# Altium footprint library AD_Lib.PcbLib: 508 footprints (part 29 of 32)
Each footprint in its own frame and in the unit in brackets; x right, y up, seen from the top. Pads: shape width x height; smd on the part's side, far side on the other; paste and mask are expansions set on the pad; w line width, h text height; cw(c..) or ccw(c..) is an arc to the next point about the centre after c.
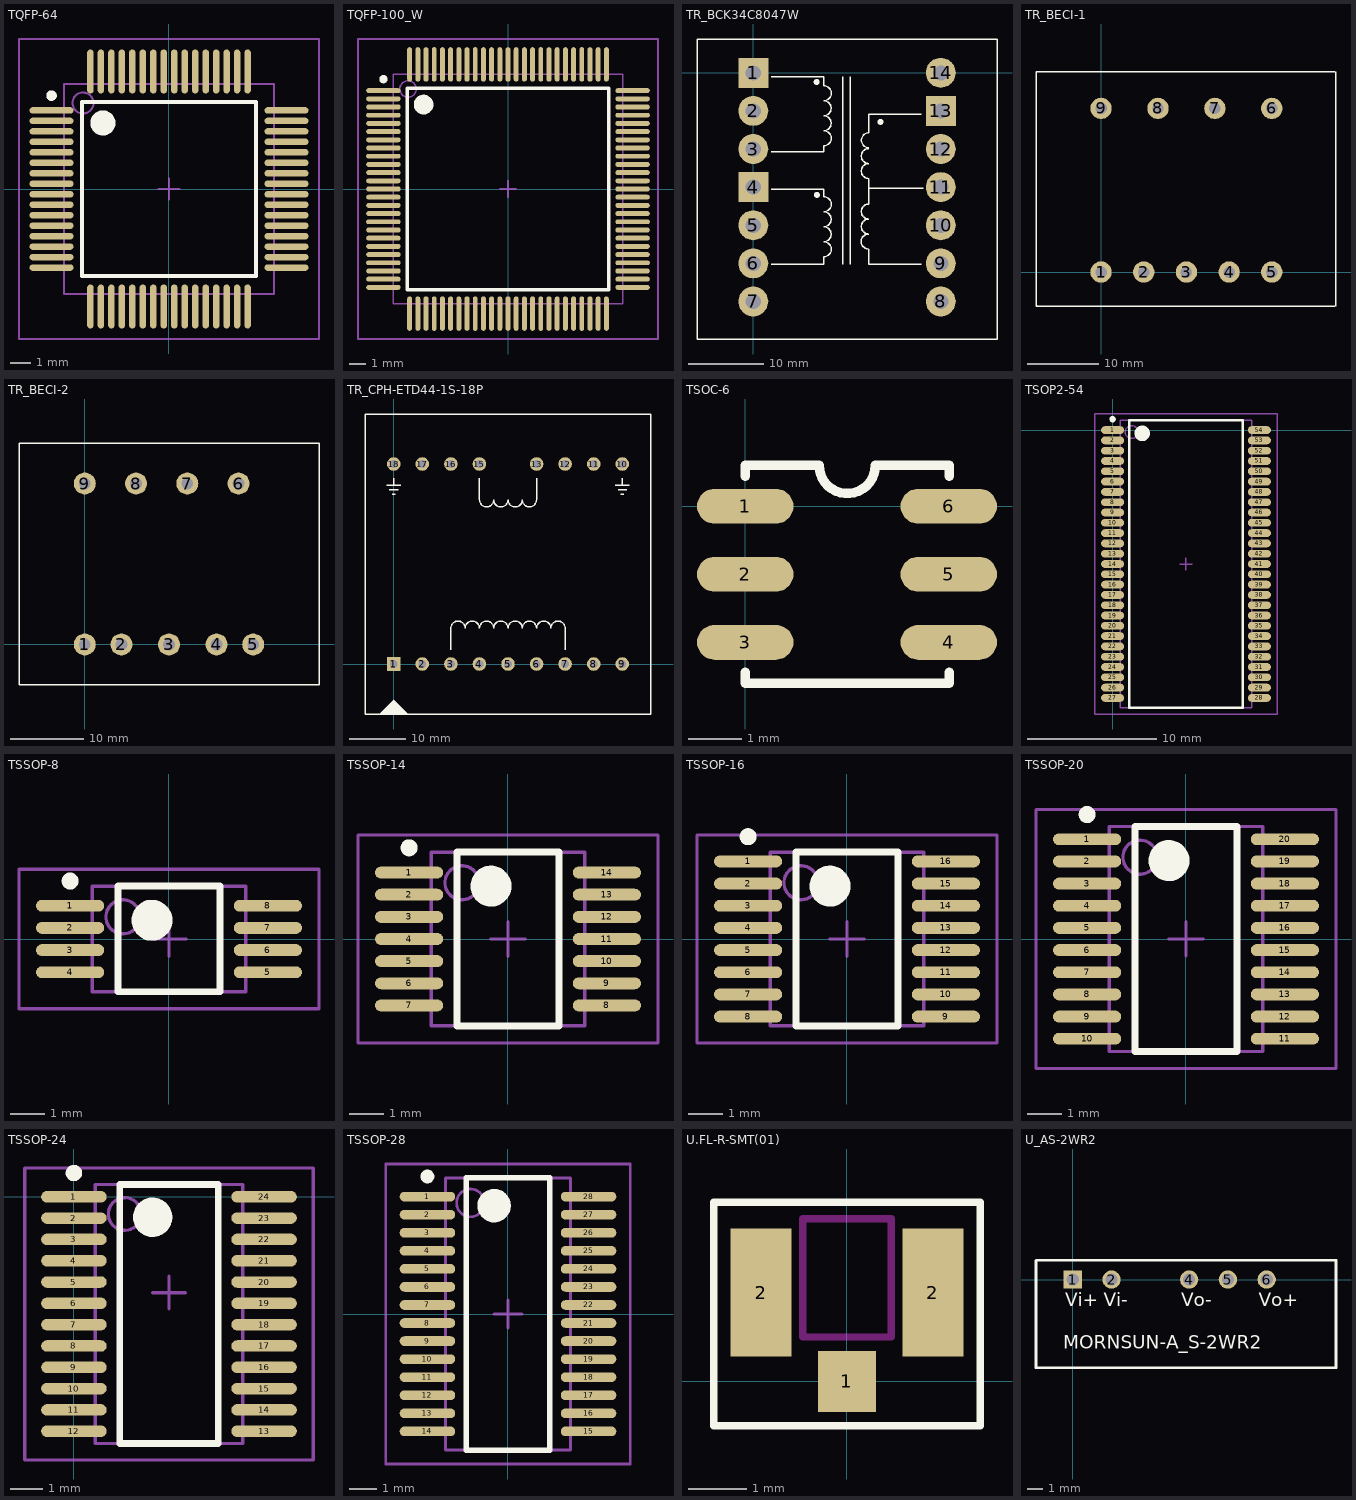
[diagram p28: the footprints below, top view; thin cyan lines are the x and y axes]

## TQFP-64 [mm] "Thin QFP, 64-Leads, Body 10x10mm, Pitch 0.5mm, IPC Low Density"
height 1.2
pads (64):
  oval 2.1x0.3 smd: 1(-5.6,3.75) 2(-5.6,3.25) 3(-5.6,2.75) 4(-5.6,2.25) 5(-5.6,1.75) 6(-5.6,1.25) 7(-5.6,0.75) 8(-5.6,0.25) 9(-5.6,-0.25) 10(-5.6,-0.75) 11(-5.6,-1.25) 12(-5.6,-1.75) 13(-5.6,-2.25) 14(-5.6,-2.75) 15(-5.6,-3.25) 16(-5.6,-3.75) 33(5.6,-3.75) 34(5.6,-3.25) 35(5.6,-2.75) 36(5.6,-2.25) 37(5.6,-1.75) 38(5.6,-1.25) 39(5.6,-0.75) 40(5.6,-0.25) 41(5.6,0.25) 42(5.6,0.75) 43(5.6,1.25) 44(5.6,1.75) 45(5.6,2.25) 46(5.6,2.75) 47(5.6,3.25) 48(5.6,3.75)
  oval 0.3x2.1 smd: 17(-3.75,-5.6) 18(-3.25,-5.6) 19(-2.75,-5.6) 20(-2.25,-5.6) 21(-1.75,-5.6) 22(-1.25,-5.6) 23(-0.75,-5.6) 24(-0.25,-5.6) 25(0.25,-5.6) 26(0.75,-5.6) 27(1.25,-5.6) 28(1.75,-5.6) 29(2.25,-5.6) 30(2.75,-5.6) 31(3.25,-5.6) 32(3.75,-5.6) 49(3.75,5.6) 50(3.25,5.6) 51(2.75,5.6) 52(2.25,5.6) 53(1.75,5.6) 54(1.25,5.6) 55(0.75,5.6) 56(0.25,5.6) 57(-0.25,5.6) 58(-0.75,5.6) 59(-1.25,5.6) 60(-1.75,5.6) 61(-2.25,5.6) 62(-2.75,5.6) 63(-3.25,5.6) 64(-3.75,5.6)
Top Overlay:
  circle w0.6: c-3.15,3.15 r0.3
  circle w0.25: c-5.6,4.45 r0.125
  lines w0.2: -4.15,-4.15 4.15,-4.15 4.15,4.15 -4.15,4.15 -4.15,-4.15
Mechanical 13:
  circle w0.1: c-4.1,4.1 r0.5
  lines w0.1: -5,-5 5,-5 5,5 -5,5 -5,-5
Mechanical 15:
  lines w0.1: -0.5,0 0.5,0 ; 0,-0.5 0,0.5 ; -7.15,-7.15 7.15,-7.15 7.15,7.15 -7.15,7.15 -7.15,-7.15
3D body "TQFP-64.STEP": height 1.59, standoff -0.01, extent -6,-6 6,6

## TQFP-100_W [mm] "100-Pin Thin Quad Flat Pack 0.5 mm Pitch, IPC Low Density"
height 1.6
pads (100):
  oval 2.1x0.3 smd: 1(-7.6,6) 2(-7.6,5.5) 3(-7.6,5) 4(-7.6,4.5) 5(-7.6,4) 6(-7.6,3.5) 7(-7.6,3) 8(-7.6,2.5) 9(-7.6,2) 10(-7.6,1.5) 11(-7.6,1) 12(-7.6,0.5) 13(-7.6,0) 14(-7.6,-0.5) 15(-7.6,-1) 16(-7.6,-1.5) 17(-7.6,-2) 18(-7.6,-2.5) 19(-7.6,-3) 20(-7.6,-3.5) 21(-7.6,-4) 22(-7.6,-4.5) 23(-7.6,-5) 24(-7.6,-5.5) 25(-7.6,-6) 51(7.6,-6) 52(7.6,-5.5) 53(7.6,-5) 54(7.6,-4.5) 55(7.6,-4) 56(7.6,-3.5) 57(7.6,-3) 58(7.6,-2.5) 59(7.6,-2) 60(7.6,-1.5) 61(7.6,-1) 62(7.6,-0.5) 63(7.6,0) 64(7.6,0.5) 65(7.6,1) 66(7.6,1.5) 67(7.6,2) 68(7.6,2.5) 69(7.6,3) 70(7.6,3.5) 71(7.6,4) 72(7.6,4.5) 73(7.6,5) 74(7.6,5.5) 75(7.6,6)
  oval 0.3x2.1 smd: 26(-6,-7.6) 27(-5.5,-7.6) 28(-5,-7.6) 29(-4.5,-7.6) 30(-4,-7.6) 31(-3.5,-7.6) 32(-3,-7.6) 33(-2.5,-7.6) 34(-2,-7.6) 35(-1.5,-7.6) 36(-1,-7.6) 37(-0.5,-7.6) 38(0,-7.6) 39(0.5,-7.6) 40(1,-7.6) 41(1.5,-7.6) 42(2,-7.6) 43(2.5,-7.6) 44(3,-7.6) 45(3.5,-7.6) 46(4,-7.6) 47(4.5,-7.6) 48(5,-7.6) 49(5.5,-7.6) 50(6,-7.6) 76(6,7.6) 77(5.5,7.6) 78(5,7.6) 79(4.5,7.6) 80(4,7.6) 81(3.5,7.6) 82(3,7.6) 83(2.5,7.6) 84(2,7.6) 85(1.5,7.6) 86(1,7.6) 87(0.5,7.6) 88(0,7.6) 89(-0.5,7.6) 90(-1,7.6) 91(-1.5,7.6) 92(-2,7.6) 93(-2.5,7.6) 94(-3,7.6) 95(-3.5,7.6) 96(-4,7.6) 97(-4.5,7.6) 98(-5,7.6) 99(-5.5,7.6) 100(-6,7.6)
Top Overlay:
  circle w0.6: c-5.15,5.15 r0.3
  circle w0.25: c-7.6,6.7 r0.125
  lines w0.2: -6.15,-6.15 6.15,-6.15 6.15,6.15 -6.15,6.15 -6.15,-6.15
Mechanical 13:
  circle w0.1: c-6.1,6.1 r0.5
  lines w0.1: -7,-7 7,-7 7,7 -7,7 -7,-7
Mechanical 15:
  lines w0.1: -0.5,0 0.5,0 ; 0,-0.5 0,0.5 ; -9.15,-9.15 9.15,-9.15 9.15,9.15 -9.15,9.15 -9.15,-9.15
3D body: height 1.6, standoff 0, extent -7,-7 7,7

## TR_BCK34C8047W [mm] "定制变压器，博多"
height 30
pads (14):
  rect 4x4 hole 2: 1(0,0) 4(0,-15.25) 13(25,-5.083)
  round 4 hole 2: 2(0,-5.083) 3(0,-10.167) 5(0,-20.333) 6(0,-25.417) 7(0,-30.5) 8(25,-30.5) 9(25,-25.417) 10(25,-20.333) 11(25,-15.25) 12(25,-10.167) 14(25,0)
Top Overlay:
  circle w0.4: c8.485,-16.284 r0.2
  circle w0.4: c8.456,-1.228 r0.2
  circle w0.4: c16.964,-6.562 r0.2
  lines w0.2: 2.406,-25.524 9.406,-25.524 9.406,-24.522 ccw(c9.406,-23.522) 9.406,-22.522 ; 2.406,-15.524 9.406,-15.524 9.406,-16.522 cw(c9.406,-17.522) 9.388,-18.522 cw(c9.388,-19.522) 9.388,-20.522 cw(c9.388,-21.522) 9.388,-22.522 ; 2.406,-10.524 9.406,-10.524 9.406,-9.72 ccw(c9.406,-8.72) 9.406,-7.72 ; 2.406,-0.524 9.406,-0.524 9.406,-1.72 cw(c9.406,-2.72) 9.388,-3.72 cw(c9.388,-4.72) 9.388,-5.72 cw(c9.388,-6.72) 9.388,-7.72 ; 11.906,-25.524 11.906,-0.524 ; 12.906,-25.524 12.906,-0.524 ; 15.388,-25.524 15.388,-23.505 cw(c15.388,-22.505) 15.406,-21.505 cw(c15.406,-20.505) 15.406,-19.505 cw(c15.406,-18.505) 15.406,-17.505 15.406,-14.102 cw(c15.406,-13.102) 15.406,-12.102 cw(c15.406,-11.102) 15.406,-10.102 ; 15.406,-25.524 22.406,-25.524 ; 15.406,-8.011 15.406,-5.524 22.406,-5.524 ; 15.425,-10.011 cw(c15.425,-9.011) 15.425,-8.011 ; 15.45,-15.403 22.653,-15.403 ; -7.5,-35.5 32.5,-35.5 32.5,4.5 -7.5,4.5 -7.5,-35.5

## TR_BECI-1 [mm] "电疗仪用原型机变压器"
height 2.642
pads (9):
  round 3 hole 1.6: 1(0,0) 2(6,0) 3(12,0) 4(18,0) 5(24,0) 6(24,23) 7(16,23) 8(8,23) 9(0,23)
Top Overlay:
  lines w0.1: -9.144,-4.572 -8.89,-4.826
  lines w0.2: 32.856,-4.826 -9.144,-4.826 -9.144,28.174 32.856,28.174 ; 33.02,-4.826 33.02,28.174
Bottom Overlay:
  circle w0.254: c0,23 r2.54
  circle w0.254: c24,23 r2.54
  circle w0.254: c0,0 r2.54
  circle w0.254: c24,0 r2.54
  text "S1" at -1.645,14.605 h5.08
  text "S2" at 22.355,14.605 h5.08
  text "P2" at 22.225,3.175 h5.08
  text "P1" at -1.775,3.175 h5.08

## TR_BECI-2 [mm] "大峰EI13x17工频变压器"
height 17
pads (9):
  round 3 hole 1.6: 1(0,0) 2(5,0) 3(11.5,0) 4(18,0) 5(23,0) 6(21,22) 7(14,22) 8(7,22) 9(0,22)
Top Overlay:
  lines w0.2: -9,-5.5 -9,27.5 32,27.5 32,-5.5 -9,-5.5
Bottom Overlay:
  circle w0.254: c20.997,22.013 r2.54
  circle w0.254: c0,22 r2.54
  circle w0.254: c23,0 r2.54
  circle w0.254: c0,0 r2.54
  text "P1" at -1.775,3.175 h5.08
  text "P2" at 22.225,3.175 h5.08
  text "S2" at 22.355,14.605 h5.08
  text "S1" at -1.645,14.605 h5.08

## TR_CPH-ETD44-1S-18P [mil]
pads (17):
  rect 95x95 hole 55: 1(0,0)
  round 95 hole 55: 2(200,0) 3(400,0) 4(600,0) 5(800,0) 6(1000,0) 7(1200,0) 8(1400,0) 9(1600,0) 10(1600,1400) 11(1400,1400) 12(1200,1400) 13(1000,1400) 15(600,1400) 16(400,1400) 17(200,1400) 18(0,1400)
Top Overlay:
  region: 0,-250 -100,-350 100,-350
  lines w10: -50,1250 50,1250 ; -30,1220 30,1220 ; -10,1190 10,1190 ; 0,1250 0,1300 ; 400,100 400,250 cw(c450,250) 450,300 cw(c450,250) 500,250 cw(c550,250) 550,300 cw(c550,250) 600,250 cw(c650,250) 650,300 cw(c650,250) 700,250 cw(c750,250) 750,300 cw(c750,250) 800,250 cw(c850,250) 850,300 cw(c850,250) 900,250 cw(c950,250) 950,300 cw(c950,250) 1000,250 cw(c1050,250) 1050,300 cw(c1050,250) 1100,250 cw(c1150,250) 1150,300 cw(c1150,250) 1200,250 1200,100 ; 600,1300 600,1150 ccw(c650,1150) 650,1100 ccw(c650,1150) 700,1150 ccw(c750,1150) 750,1100 ccw(c750,1150) 800,1150 ccw(c850,1150) 850,1100 ccw(c850,1150) 900,1150 ccw(c950,1150) 950,1100 ccw(c950,1150) 1000,1150 1000,1300 ; 1550,1250 1650,1250 ; 1570,1220 1630,1220 ; 1590,1190 1610,1190 ; 1600,1250 1600,1300 ; -200,-350 1800,-350 1800,1750 -200,1750 -200,-350
Bottom Overlay:
  circle w10: c999.64,1235 r35.36
  circle w10: c1199.64,165 r35.36
  circle w10: c1200,0 r90.14
  circle w10: c1000,1400 r90.14
  lines w10: 325,-75 325,75 475,75 475,-75 325,-75 ; 525,1325 675,1325 675,1475 525,1475 525,1325
  text "次级" at 875,85 h100
  text "初级" at 890,1250 h100

## TSOC-6 [mm] "Small Outline; 6 C-Bend Leads; Body Width 3.8 mm; Pitch 1.27 mm"
height 1.5
pads (6):
  oval 1.8x0.65 smd: 1(0,0) 2(0,-1.27) 3(0,-2.54) 4(3.8,-2.54) 5(3.8,-1.27) 6(3.8,0)
Top Overlay:
  lines w0.178: 0,-3.099 0,-3.302 3.81,-3.302 3.81,-3.099 ; 0,0.559 0,0.762 1.381,0.762 ccw(c1.905,0.762) 2.429,0.762 3.81,0.762 3.81,0.559

## TSOP2-54 [mm] "SOP, 54-Leads, Body 22.2x10.16mm, Pitch 0.8mm, IPC Low Density"
height 1.2
pads (54):
  oval 1.8x0.6 smd: 1(0,0) 2(0,-0.8) 3(0,-1.6) 4(0,-2.4) 5(0,-3.2) 6(0,-4) 7(0,-4.8) 8(0,-5.6) 9(0,-6.4) 10(0,-7.2) 11(0,-8) 12(0,-8.8) 13(0,-9.6) 14(0,-10.4) 15(0,-11.2) 16(0,-12) 17(0,-12.8) 18(0,-13.6) 19(0,-14.4) 20(0,-15.2) 21(0,-16) 22(0,-16.8) 23(0,-17.6) 24(0,-18.4) 25(0,-19.2) 26(0,-20) 27(0,-20.8) 28(11.4,-20.8) 29(11.4,-20) 30(11.4,-19.2) 31(11.4,-18.4) 32(11.4,-17.6) 33(11.4,-16.8) 34(11.4,-16) 35(11.4,-15.2) 36(11.4,-14.4) 37(11.4,-13.6) 38(11.4,-12.8) 39(11.4,-12) 40(11.4,-11.2) 41(11.4,-10.4) 42(11.4,-9.6) 43(11.4,-8.8) 44(11.4,-8) 45(11.4,-7.2) 46(11.4,-6.4) 47(11.4,-5.6) 48(11.4,-4.8) 49(11.4,-4) 50(11.4,-3.2) 51(11.4,-2.4) 52(11.4,-1.6) 53(11.4,-0.8) 54(11.4,0)
Top Overlay:
  circle w0.6: c2.3,-0.25 r0.3
  circle w0.25: c0,0.85 r0.125
  lines w0.2: 1.3,-21.55 10.1,-21.55 10.1,0.75 1.3,0.75 1.3,-21.55
Mechanical 13:
  circle w0.1: c1.48,-0.15 r0.5
  lines w0.1: 0.58,-21.55 10.82,-21.55 10.82,0.75 0.58,0.75 0.58,-21.55
Mechanical 15:
  lines w0.1: 5.2,-10.4 6.2,-10.4 ; 5.7,-10.9 5.7,-9.9 ; -1.4,-22.05 12.8,-22.05 12.8,1.25 -1.4,1.25 -1.4,-22.05
3D body: height 1.2, standoff 0, extent 0.58,-21.55 10.82,0.75

## TSSOP-8 [mm] "TSOP, 8-Leads, Body 3x4.4mm, Pitch 0.65mm, IPC Low Density"
height 1.2
pads (8):
  oval 2x0.35 smd: 1(-2.9,0.975) 2(-2.9,0.325) 3(-2.9,-0.325) 4(-2.9,-0.975) 5(2.9,-0.975) 6(2.9,-0.325) 7(2.9,0.325) 8(2.9,0.975)
Top Overlay:
  circle w0.6: c-0.5,0.55 r0.3
  circle w0.25: c-2.9,1.7 r0.125
  lines w0.2: -1.5,-1.55 1.5,-1.55 1.5,1.55 -1.5,1.55 -1.5,-1.55
Mechanical 13:
  circle w0.1: c-1.35,0.65 r0.5
  lines w0.1: -2.25,-1.55 2.25,-1.55 2.25,1.55 -2.25,1.55 -2.25,-1.55
Mechanical 15:
  lines w0.1: -0.5,0 0.5,0 ; 0,-0.5 0,0.5 ; -4.4,-2.05 4.4,-2.05 4.4,2.05 -4.4,2.05 -4.4,-2.05
3D body: height 1.2, standoff 0, extent -2.25,-1.55 2.25,1.55

## TSSOP-14 [mm] "TSOP, 14-Leads, Body 5x4.4mm, Pitch 0.65mm, IPC Low Density"
height 1.2
pads (14):
  oval 2x0.35 smd: 1(-2.9,1.95) 2(-2.9,1.3) 3(-2.9,0.65) 4(-2.9,0) 5(-2.9,-0.65) 6(-2.9,-1.3) 7(-2.9,-1.95) 8(2.9,-1.95) 9(2.9,-1.3) 10(2.9,-0.65) 11(2.9,0) 12(2.9,0.65) 13(2.9,1.3) 14(2.9,1.95)
Top Overlay:
  circle w0.6: c-0.5,1.55 r0.3
  circle w0.25: c-2.9,2.675 r0.125
  lines w0.2: -1.5,-2.55 1.5,-2.55 1.5,2.55 -1.5,2.55 -1.5,-2.55
Mechanical 13:
  circle w0.1: c-1.35,1.65 r0.5
  lines w0.1: -2.25,-2.55 2.25,-2.55 2.25,2.55 -2.25,2.55 -2.25,-2.55
Mechanical 15:
  lines w0.1: -0.5,0 0.5,0 ; 0,-0.5 0,0.5 ; -4.4,-3.05 4.4,-3.05 4.4,3.05 -4.4,3.05 -4.4,-3.05
3D body: height 1.2, standoff 0, extent -2.25,-2.55 2.25,2.55

## TSSOP-16 [mm] "TSOP, 16-Leads, Body 5x4.4mm, Pitch 0.65mm, IPC Low Density"
height 1.2
pads (16):
  oval 2x0.35 smd: 1(-2.9,2.275) 2(-2.9,1.625) 3(-2.9,0.975) 4(-2.9,0.325) 5(-2.9,-0.325) 6(-2.9,-0.975) 7(-2.9,-1.625) 8(-2.9,-2.275) 9(2.9,-2.275) 10(2.9,-1.625) 11(2.9,-0.975) 12(2.9,-0.325) 13(2.9,0.325) 14(2.9,0.975) 15(2.9,1.625) 16(2.9,2.275)
Top Overlay:
  circle w0.6: c-0.5,1.55 r0.3
  circle w0.25: c-2.9,3 r0.125
  lines w0.2: -1.5,-2.55 1.5,-2.55 1.5,2.55 -1.5,2.55 -1.5,-2.55
Mechanical 13:
  circle w0.1: c-1.35,1.65 r0.5
  lines w0.1: -2.25,-2.55 2.25,-2.55 2.25,2.55 -2.25,2.55 -2.25,-2.55
Mechanical 15:
  lines w0.1: -0.5,0 0.5,0 ; 0,-0.5 0,0.5 ; -4.4,-3.05 4.4,-3.05 4.4,3.05 -4.4,3.05 -4.4,-3.05
3D body: height 1.2, standoff 0, extent -2.25,-2.55 2.25,2.55

## TSSOP-20 [mm] "TSOP, 20-Leads, Body 6.5x4.4mm, Pitch 0.65mm, IPC Low Density"
height 1.2
pads (20):
  oval 2x0.35 smd: 1(-2.9,2.925) 2(-2.9,2.275) 3(-2.9,1.625) 4(-2.9,0.975) 5(-2.9,0.325) 6(-2.9,-0.325) 7(-2.9,-0.975) 8(-2.9,-1.625) 9(-2.9,-2.275) 10(-2.9,-2.925) 11(2.9,-2.925) 12(2.9,-2.275) 13(2.9,-1.625) 14(2.9,-0.975) 15(2.9,-0.325) 16(2.9,0.325) 17(2.9,0.975) 18(2.9,1.625) 19(2.9,2.275) 20(2.9,2.925)
Top Overlay:
  circle w0.25: c-2.9,3.65 r0.125
  circle w0.6: c-0.5,2.3 r0.3
  lines w0.2: -1.5,-3.3 -1.5,3.3 1.5,3.3 1.5,-3.3 -1.5,-3.3
Mechanical 13:
  circle w0.1: c-1.35,2.4 r0.5
  lines w0.1: -2.25,-3.3 -2.25,3.3 2.25,3.3 2.25,-3.3 -2.25,-3.3
Mechanical 15:
  lines w0.1: -0.5,0 0.5,0 ; 0,-0.5 0,0.5 ; -4.4,-3.8 -4.4,3.8 4.4,3.8 4.4,-3.8 -4.4,-3.8
3D body: height 1.2, standoff 0, extent -2.25,-3.3 2.25,3.3

## TSSOP-24 [mm] "TSOP, 24-Leads, Body 7.8x4.4mm, Pitch 0.65mm, IPC Low Density"
height 1.2
pads (24):
  oval 2x0.35 smd: 1(0,0) 2(0,-0.65) 3(0,-1.3) 4(0,-1.95) 5(0,-2.6) 6(0,-3.25) 7(0,-3.9) 8(0,-4.55) 9(0,-5.2) 10(0,-5.85) 11(0,-6.5) 12(0,-7.15) 13(5.8,-7.15) 14(5.8,-6.5) 15(5.8,-5.85) 16(5.8,-5.2) 17(5.8,-4.55) 18(5.8,-3.9) 19(5.8,-3.25) 20(5.8,-2.6) 21(5.8,-1.95) 22(5.8,-1.3) 23(5.8,-0.65) 24(5.8,0)
Top Overlay:
  circle w0.25: c0,0.725 r0.125
  circle w0.6: c2.4,-0.625 r0.3
  lines w0.2: 1.4,-7.525 1.4,0.375 4.4,0.375 4.4,-7.525 1.4,-7.525
Mechanical 13:
  circle w0.1: c1.55,-0.525 r0.5
  lines w0.1: 0.65,-7.525 0.65,0.375 5.15,0.375 5.15,-7.525 0.65,-7.525
Mechanical 15:
  lines w0.1: 2.4,-2.925 3.4,-2.925 ; 2.9,-3.425 2.9,-2.425 ; -1.5,-8.025 -1.5,0.875 7.3,0.875 7.3,-8.025 -1.5,-8.025
3D body: height 1.2, standoff 0, extent 0.65,-7.525 5.15,0.375

## TSSOP-28 [mm] "TSOP, 28-Leads, Body 9.7x4.4mm, Pitch 0.65mm, IPC Low Density"
height 1.1
pads (28):
  oval 2x0.35 smd: 1(-2.9,4.225) 2(-2.9,3.575) 3(-2.9,2.925) 4(-2.9,2.275) 5(-2.9,1.625) 6(-2.9,0.975) 7(-2.9,0.325) 8(-2.9,-0.325) 9(-2.9,-0.975) 10(-2.9,-1.625) 11(-2.9,-2.275) 12(-2.9,-2.925) 13(-2.9,-3.575) 14(-2.9,-4.225) 15(2.9,-4.225) 16(2.9,-3.575) 17(2.9,-2.925) 18(2.9,-2.275) 19(2.9,-1.625) 20(2.9,-0.975) 21(2.9,-0.325) 22(2.9,0.325) 23(2.9,0.975) 24(2.9,1.625) 25(2.9,2.275) 26(2.9,2.925) 27(2.9,3.575) 28(2.9,4.225)
Top Overlay:
  circle w0.6: c-0.5,3.9 r0.3
  circle w0.25: c-2.9,4.95 r0.125
  lines w0.2: -1.5,-4.9 1.5,-4.9 1.5,4.9 -1.5,4.9 -1.5,-4.9
Mechanical 13:
  circle w0.1: c-1.35,4 r0.5
  lines w0.1: -2.25,-4.9 2.25,-4.9 2.25,4.9 -2.25,4.9 -2.25,-4.9
Mechanical 15:
  lines w0.1: -0.5,0 0.5,0 ; 0,-0.5 0,0.5 ; -4.4,-5.4 4.4,-5.4 4.4,5.4 -4.4,5.4 -4.4,-5.4
3D body: height 1.1, standoff 0, extent -2.25,-4.9 2.25,4.9

## U.FL-R-SMT(01) [mm] "天线插座"
height 1.25
pads (3):
  rect 1x1.05 smd: 1(0,0)
  rect 1.05x2.2 smd: 2(-1.475,1.525) 2(1.475,1.525)
Top Overlay:
  lines w0.127: -2.286,-0.761 2.286,-0.761 2.286,3.075 -2.286,3.075 -2.286,-0.761
Keep-Out Layer:
  lines w0.127: -0.762,0.763 -0.762,2.795 0.762,2.795 0.762,0.763 -0.762,0.763

## U_AS-2WR2 [mm] "DC/DC, A_S-2WR2、B_S-2WR2系列, MORNSUN"
height 10.16
pads (5):
  rect 1.2x1.2 hole 0.8: 1(0,0)
  round 1.2 hole 0.8: 2(2.54,0) 4(7.62,0) 5(10.16,0) 6(12.7,0)
Top Overlay:
  lines w0.178: -2.41,-5.78 -2.41,1.25 -2.39,1.27 17.24,1.27 17.24,-5.78 -2.41,-5.78
  text "Vi+" at -0.508,-2.032 h1.52
  text "Vi-" at 2.032,-2.032 h1.52
  text "MORNSUN-A_S-2WR2" at -0.635,-4.826 h1.52
  text "Vo+" at 12.192,-2.032 h1.52
  text "Vo-" at 7.112,-2.032 h1.52
Bottom Overlay:
  text "Vi-" at 3.556,-2.032 h1.52
  text "Vi+" at 1.143,-2.032 h1.52
  text "Vo-" at 8.89,-2.032 h1.52
  text "Vo+" at 14.224,-2.032 h1.52